# Altium footprint library Connectors.PcbLib: 158 footprints (part 1 of 10)
Each footprint in its own frame and in the unit in brackets; x right, y up, seen from the top. Pads: shape width x height; smd on the part's side, far side on the other; paste and mask are expansions set on the pad; w line width, h text height; cw(c..) or ccw(c..) is an arc to the next point about the centre after c.
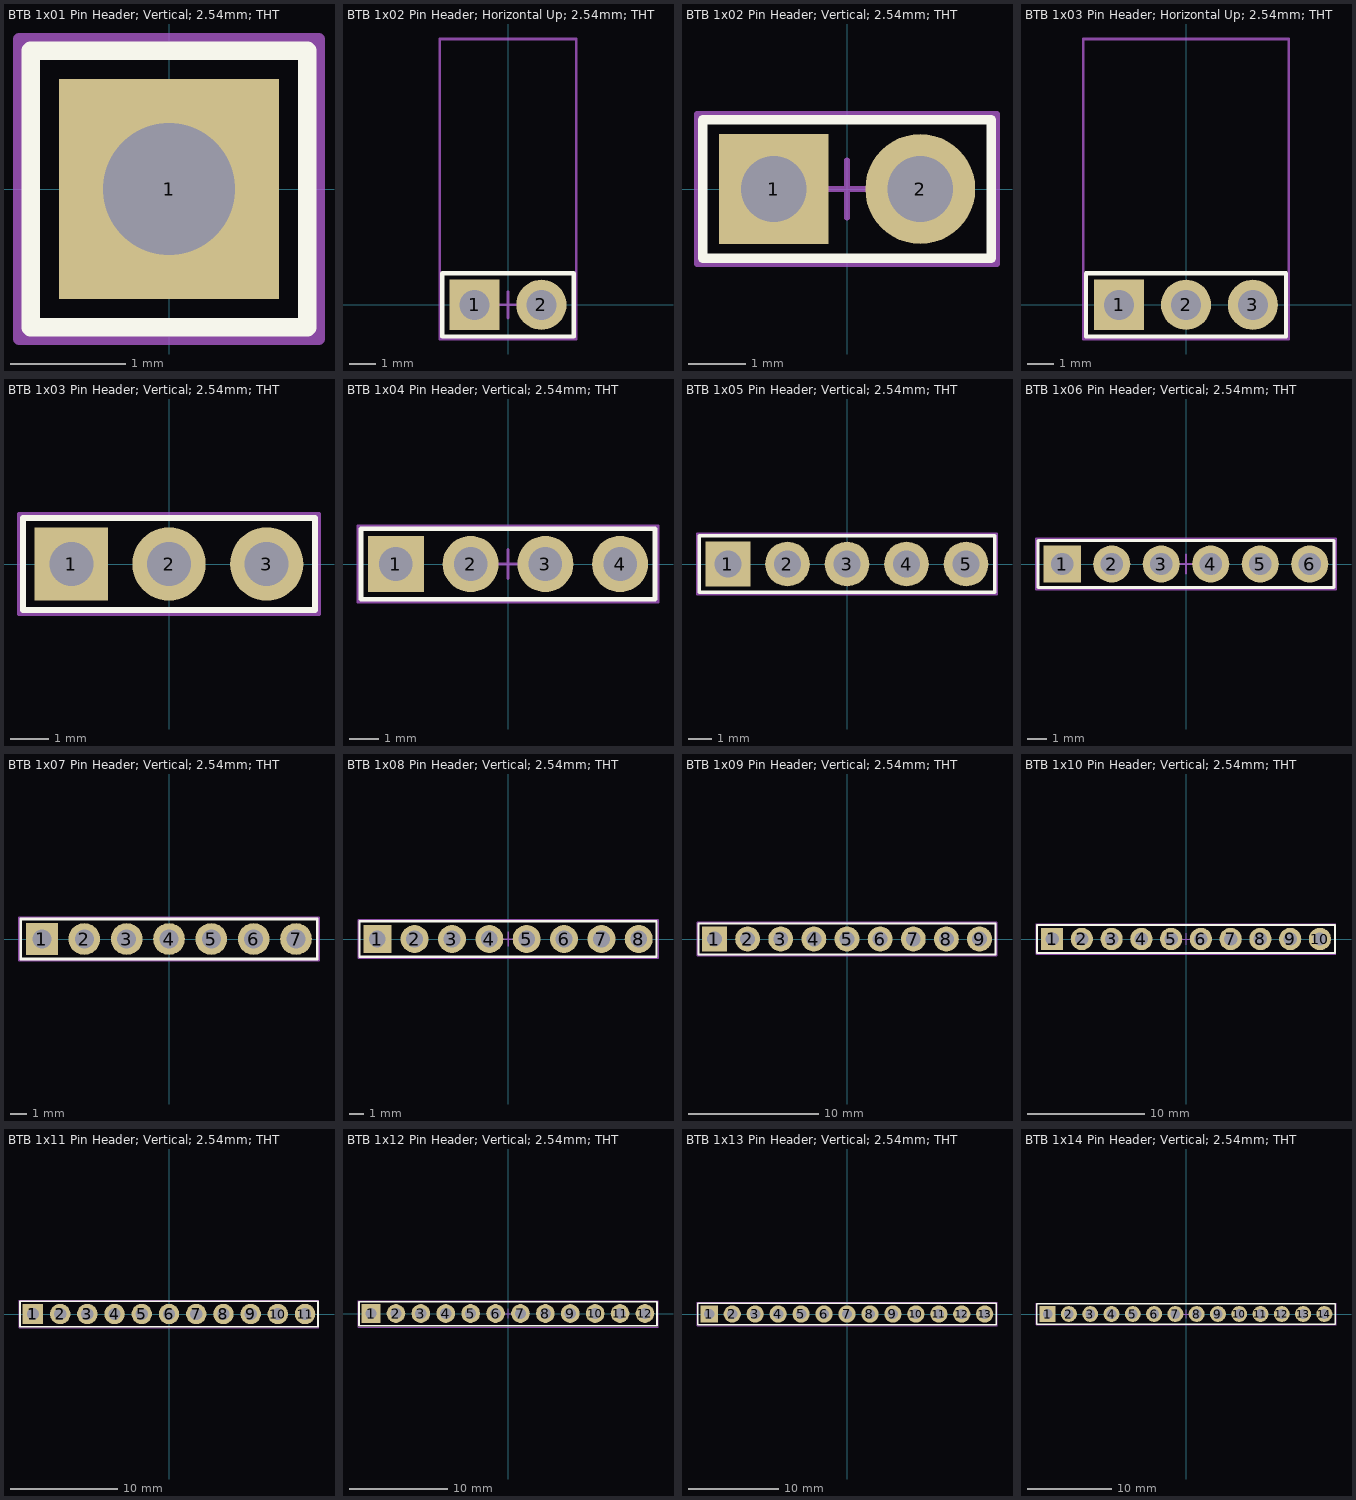
[diagram p0: the footprints below, top view; thin cyan lines are the x and y axes]

## BTB 1x01 Pin Header; Vertical; 2.54mm; THT [mil]
pads (1):
  rect 75x75 hole 45: 1(0,0)
Top Overlay:
  lines w6.3: -47.24,-47.24 47.24,-47.24 47.24,47.24 -47.24,47.24 -47.24,-47.24
Mechanical 11:
  lines w3.94: -51.18,-51.18 -51.18,51.18 51.18,51.18 51.18,-51.18 -51.18,-51.18
Mechanical 15:
  lines w3.94: -19.68,0 19.68,0 ; 0,-19.68 0,19.68
3D body "BTB 1x1 Pin Header; Vertical; 2.54mm; THT.stp": height 337.22, standoff -117.11, extent -49.99,-49.99 50.01,50.01

## BTB 1x02 Pin Header; Horizontal Up; 2.54mm; THT [mil]
pads (2):
  rect 75x75 hole 45: 1(-50,0)
  round 75 hole 45: 2(50,0)
Top Overlay:
  lines w6.3: -98.43,-47.24 -98.43,47.24 98.43,47.24 98.43,-47.24 -98.43,-47.24
Mechanical 11:
  lines w3.94: -102.36,-51.18 102.36,-51.18 102.36,397.64 -102.36,397.64 -102.36,-51.18
Mechanical 15:
  lines w3.94: -19.68,0 19.68,0 ; 0,-19.68 0,19.68
3D body "BTB 1x2 Pin Header; Horizontal; 2.54mm; THT.stp": height 101, standoff -117.11, extent -100.01,-11.66 99.99,396.21

## BTB 1x02 Pin Header; Vertical; 2.54mm; THT [mil]
pads (2):
  rect 75x75 hole 45: 1(-50,0)
  round 75 hole 45: 2(50,0)
Top Overlay:
  lines w6.3: -98.43,-47.24 -98.43,47.24 98.43,47.24 98.43,-47.24 -98.43,-47.24
Mechanical 11:
  lines w3.94: -102.36,-51.18 102.36,-51.18 102.36,51.18 -102.36,51.18 -102.36,-51.18
Mechanical 15:
  lines w3.94: -19.68,0 19.68,0 ; 0,-19.68 0,19.68
3D body "BTB 1x2 Pin Header; Vertical; 2.54mm; THT.stp": height 337.22, standoff -117.11, extent -99.99,-49.99 100.01,50.01

## BTB 1x03 Pin Header; Horizontal Up; 2.54mm; THT [mil]
pads (3):
  rect 75x75 hole 45: 1(-100,0)
  round 75 hole 45: 2(0,0) 3(100,0)
Top Overlay:
  lines w6.3: -149.61,-47.24 149.61,-47.24 149.61,47.24 -149.61,47.24 -149.61,-47.24
Mechanical 11:
  lines w3.94: -153.54,-51.18 153.54,-51.18 153.54,397.64 -153.54,397.64 -153.54,-51.18
Mechanical 15:
  lines w3.94: -19.68,0 19.68,0 ; 0,-19.68 0,19.68
3D body "BTB 1x3 Pin Header; Horizontal; 2.54mm; THT.stp": height 101, standoff -117.11, extent -150.01,-11.66 149.99,396.21

## BTB 1x03 Pin Header; Vertical; 2.54mm; THT [mil]
pads (3):
  rect 75x75 hole 45: 1(-100,0)
  round 75 hole 45: 2(0,0) 3(100,0)
Top Overlay:
  lines w6.3: -149.61,-47.24 -149.61,47.24 149.61,47.24 149.61,-47.24 -149.61,-47.24
Mechanical 11:
  lines w3.94: -153.54,-51.18 153.54,-51.18 153.54,51.18 -153.54,51.18 -153.54,-51.18
Mechanical 15:
  lines w3.94: -19.68,0 19.68,0 ; 0,-19.68 0,19.68
3D body "BTB 1x3 Pin Header; Vertical; 2.54mm; THT.stp": height 337.22, standoff -117.11, extent -149.99,-49.99 150.01,50.01

## BTB 1x04 Pin Header; Vertical; 2.54mm; THT [mil]
pads (4):
  rect 75x75 hole 45: 1(-150,0)
  round 75 hole 45: 2(-50,0) 3(50,0) 4(150,0)
Top Overlay:
  lines w6.3: -196.85,-47.24 -196.85,47.24 196.85,47.24 196.85,-47.24 -196.85,-47.24
Mechanical 11:
  lines w3.94: -200.79,-51.18 -200.79,51.18 200.79,51.18 200.79,-51.18 -200.79,-51.18
Mechanical 15:
  lines w3.94: -19.68,0 19.68,0 ; 0,-19.68 0,19.68
3D body "BTB 1x4 Pin Header; Vertical; 2.54mm; THT.stp": height 337.22, standoff -117.11, extent -199.99,-49.99 200.01,50.01

## BTB 1x05 Pin Header; Vertical; 2.54mm; THT [mil]
pads (5):
  rect 75x75 hole 45: 1(-200,0)
  round 75 hole 45: 2(-100,0) 3(0,0) 4(100,0) 5(200,0)
Top Overlay:
  lines w6.3: -248.03,-47.24 248.03,-47.24 248.03,47.24 -248.03,47.24 -248.03,-47.24
Mechanical 11:
  lines w3.94: -251.97,-51.18 -251.97,51.18 251.97,51.18 251.97,-51.18 -251.97,-51.18
Mechanical 15:
  lines w3.94: -19.68,0 19.68,0 ; 0,-19.68 0,19.68
3D body "BTB 1x5 Pin Header; Vertical; 2.54mm; THT.stp": height 337.22, standoff -117.11, extent -249.99,-49.99 250.01,50.01

## BTB 1x06 Pin Header; Vertical; 2.54mm; THT [mil]
pads (6):
  rect 75x75 hole 45: 1(-250,0)
  round 75 hole 45: 2(-150,0) 3(-50,0) 4(50,0) 5(150,0) 6(250,0)
Top Overlay:
  lines w6.3: -299.21,-47.24 299.21,-47.24 299.21,47.24 -299.21,47.24 -299.21,-47.24
Mechanical 11:
  lines w3.94: -303.15,-51.18 -303.15,51.18 303.15,51.18 303.15,-51.18 -303.15,-51.18
Mechanical 15:
  lines w3.94: -19.68,0 19.68,0 ; 0,-19.68 0,19.68
3D body "BTB 1x6 Pin Header; Vertical; 2.54mm; THT.stp": height 337.22, standoff -117.11, extent -299.99,-49.99 300.01,50.01

## BTB 1x07 Pin Header; Vertical; 2.54mm; THT [mil]
pads (7):
  rect 75x75 hole 45: 1(-300,0)
  round 75 hole 45: 2(-200,0) 3(-100,0) 4(0,0) 5(100,0) 6(200,0) 7(300,0)
Top Overlay:
  lines w6.3: -350.39,-47.24 350.39,-47.24 350.39,47.24 -350.39,47.24 -350.39,-47.24
Mechanical 11:
  lines w3.94: -354.33,-51.18 -354.33,51.18 354.33,51.18 354.33,-51.18 -354.33,-51.18
Mechanical 15:
  lines w3.94: -19.68,0 19.68,0 ; 0,-19.68 0,19.68
3D body "BTB 1x7 Pin Header; Vertical; 2.54mm; THT.stp": height 337.22, standoff -117.11, extent -349.99,-49.99 350.01,50.01

## BTB 1x08 Pin Header; Vertical; 2.54mm; THT [mil]
pads (8):
  rect 75x75 hole 45: 1(-350,0)
  round 75 hole 45: 2(-250,0) 3(-150,0) 4(-50,0) 5(50,0) 6(150,0) 7(250,0) 8(350,0)
Top Overlay:
  lines w6.3: -397.64,-47.24 -397.64,47.24 397.64,47.24 397.64,-47.24 -397.64,-47.24
Mechanical 11:
  lines w3.94: -401.57,-51.18 401.57,-51.18 401.57,51.18 -401.57,51.18 -401.57,-51.18
Mechanical 15:
  lines w3.94: -19.68,0 19.68,0 ; 0,-19.68 0,19.68
3D body "BTB 1x8 Pin Header; Vertical; 2.54mm; THT.stp": height 337.22, standoff -117.11, extent -399.99,-49.99 400.01,50.01

## BTB 1x09 Pin Header; Vertical; 2.54mm; THT [mil]
pads (9):
  rect 75x75 hole 45: 1(-400,0)
  round 75 hole 45: 2(-300,0) 3(-200,0) 4(-100,0) 5(0,0) 6(100,0) 7(200,0) 8(300,0) 9(400,0)
Top Overlay:
  lines w6.3: -448.82,-47.24 -448.82,47.24 448.82,47.24 448.82,-47.24 -448.82,-47.24
Mechanical 11:
  lines w3.94: -452.76,-51.18 -452.76,51.18 452.76,51.18 452.76,-51.18 -452.76,-51.18
Mechanical 15:
  lines w3.94: -19.68,0 19.68,0 ; 0,-19.68 0,19.68
3D body "BTB 1x9 Pin Header; Vertical; 2.54mm; THT.stp": height 337.22, standoff -117.11, extent -449.99,-49.99 450.01,50.01

## BTB 1x10 Pin Header; Vertical; 2.54mm; THT [mil]
pads (10):
  rect 75x75 hole 45: 1(-450,0)
  round 75 hole 45: 2(-350,0) 3(-250,0) 4(-150,0) 5(-50,0) 6(50,0) 7(150,0) 8(250,0) 9(350,0) 10(450,0)
Top Overlay:
  lines w6.3: -500,-47.24 -500,47.24 500,47.24 500,-47.24 -500,-47.24
Mechanical 11:
  lines w3.94: -503.94,-51.18 503.94,-51.18 503.94,51.18 -503.94,51.18 -503.94,-51.18
Mechanical 15:
  lines w3.94: -19.68,0 19.68,0 ; 0,-19.68 0,19.68
3D body "BTB 1x10 Pin Header; Vertical; 2.54mm; THT.stp": height 337.22, standoff -117.11, extent -499.99,-49.99 500.01,50.01

## BTB 1x11 Pin Header; Vertical; 2.54mm; THT [mil]
pads (11):
  rect 75x75 hole 45: 1(-500,0)
  round 75 hole 45: 2(-400,0) 3(-300,0) 4(-200,0) 5(-100,0) 6(0,0) 7(100,0) 8(200,0) 9(300,0) 10(400,0) 11(500,0)
Top Overlay:
  lines w6.3: -547.24,-47.24 547.24,-47.24 547.24,47.24 -547.24,47.24 -547.24,-47.24
Mechanical 11:
  lines w3.94: -551.18,-51.18 -551.18,51.18 551.18,51.18 551.18,-51.18 -551.18,-51.18
Mechanical 15:
  lines w3.94: -19.68,0 19.68,0 ; 0,-19.68 0,19.68
3D body "BTB 1x5 Pin Header; Vertical; 2.54mm; THT.stp": height 337.22, standoff -117.11, extent -549.99,-49.99 -49.99,50.01
3D body "BTB 1x6 Pin Header; Vertical; 2.54mm; THT.stp": height 337.22, standoff -117.11, extent -50,-50 550,50

## BTB 1x12 Pin Header; Vertical; 2.54mm; THT [mil]
pads (12):
  rect 75x75 hole 45: 1(-550,0)
  round 75 hole 45: 2(-450,0) 3(-350,0) 4(-250,0) 5(-150,0) 6(-50,0) 7(50,0) 8(150,0) 9(250,0) 10(350,0) 11(450,0) 12(550,0)
Top Overlay:
  lines w6.3: -598.43,-50 598.43,-50 598.43,47.24 -598.43,47.24 -598.43,-50
Mechanical 11:
  lines w3.94: -602.36,-55.12 602.36,-55.12 602.36,51.18 -602.36,51.18 -602.36,-55.12
Mechanical 15:
  lines w3.94: -19.68,0 19.68,0 ; 0,-19.68 0,19.68
3D body "BTB 1x12 Pin Header; Vertical; 2.54mm; THT.stp": height 337.22, standoff -117.11, extent -600,-50 600,50

## BTB 1x13 Pin Header; Vertical; 2.54mm; THT [mil]
pads (13):
  rect 75x75 hole 45: 1(-600,0)
  round 75 hole 45: 2(-500,0) 3(-400,0) 4(-300,0) 5(-200,0) 6(-100,0) 7(0,0) 8(100,0) 9(200,0) 10(300,0) 11(400,0) 12(500,0) 13(600,0)
Top Overlay:
  lines w6.3: -649.61,-47.24 649.61,-47.24 649.61,47.24 -649.61,47.24 -649.61,-47.24
Mechanical 11:
  lines w3.94: -653.54,-51.18 653.54,-51.18 653.54,51.18 -653.54,51.18 -653.54,-51.18
Mechanical 15:
  lines w3.94: -19.68,0 19.68,0 ; 0,-19.68 0,19.68
3D body "BTB 1x6 Pin Header; Vertical; 2.54mm; THT.stp": height 337.22, standoff -117.11, extent -649.99,-49.99 -49.99,50.01
3D body "BTB 1x7 Pin Header; Vertical; 2.54mm; THT.stp": height 337.22, standoff -117.11, extent -50,-50 650,50

## BTB 1x14 Pin Header; Vertical; 2.54mm; THT [mil]
pads (14):
  rect 75x75 hole 45: 1(-650,0)
  round 75 hole 45: 2(-550,0) 3(-450,0) 4(-350,0) 5(-250,0) 6(-150,0) 7(-50,0) 8(50,0) 9(150,0) 10(250,0) 11(350,0) 12(450,0) 13(550,0) 14(650,0)
Top Overlay:
  lines w6.3: -700.79,-47.24 700.79,-47.24 700.79,47.24 -700.79,47.24 -700.79,-47.24
Mechanical 11:
  lines w3.94: -704.72,-51.18 -704.72,51.18 704.72,51.18 704.72,-51.18 -704.72,-51.18
Mechanical 15:
  lines w3.94: -19.68,0 19.68,0 ; 0,-19.68 0,19.68
3D body "BTB 1x14 Pin Header; Vertical; 2.54mm; THT.stp": height 337.22, standoff -117.11, extent -699.99,-49.99 700.01,50.01